# Altium footprint library Cty1.PcbLib: 869 footprints (part 29 of 55)
Each footprint in its own frame and in the unit in brackets; x right, y up, seen from the top. Pads: shape width x height; smd on the part's side, far side on the other; paste and mask are expansions set on the pad; w line width, h text height; cw(c..) or ccw(c..) is an arc to the next point about the centre after c.
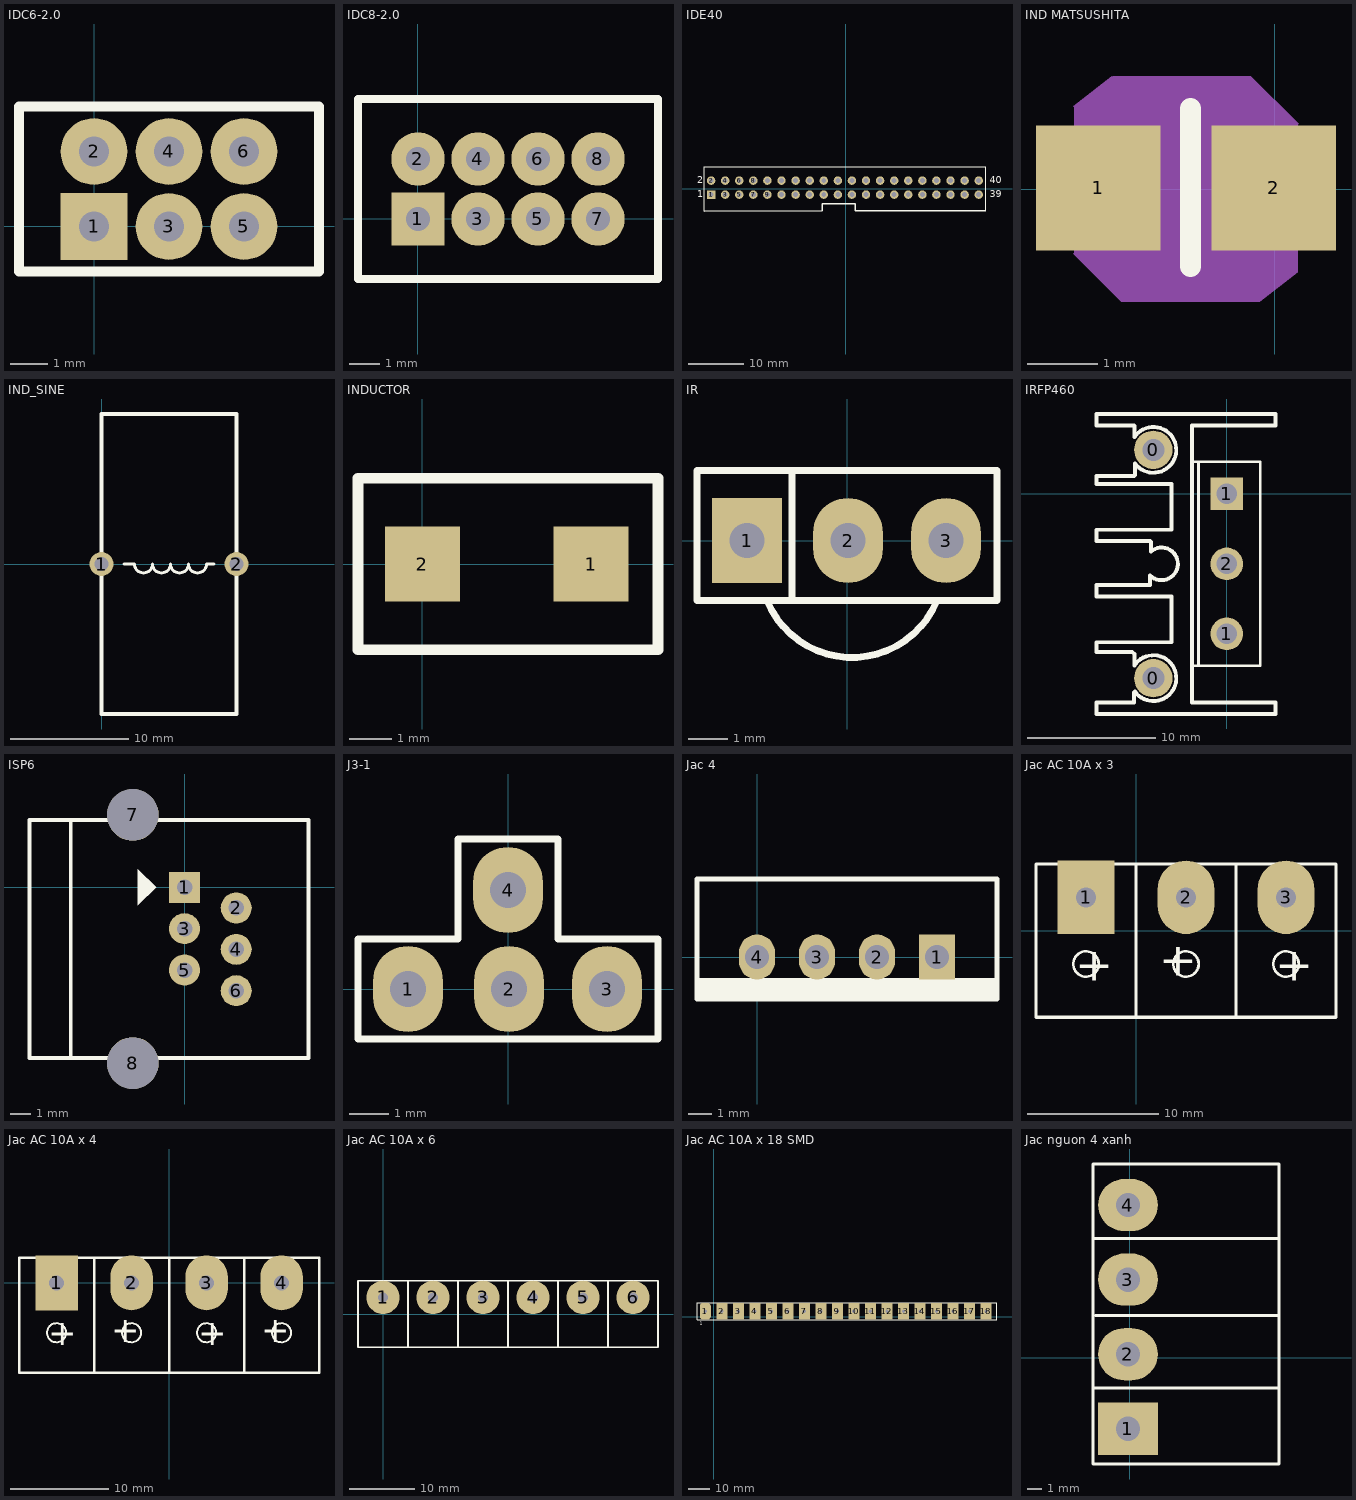
[diagram p28: the footprints below, top view; thin cyan lines are the x and y axes]

## IDC6-2.0 [mil]
pads (6):
  rect 70x70 hole 32 unplated: 1(0,0)
  round 70 hole 32 unplated: 2(0,78.74) 3(78.74,0) 4(78.74,78.74) 5(157.48,0) 6(157.48,78.74)
Top Overlay:
  lines w10: -78.74,-47.24 236.22,-47.24 236.22,125.98 -78.74,125.98 -78.74,-47.24

## IDC8-2.0 [mil]
pads (8):
  rect 70x70 hole 32 unplated: 1(0,0)
  round 70 hole 32 unplated: 2(0,78.74) 3(78.74,0) 4(78.74,78.74) 5(157.48,0) 6(157.48,78.74) 7(236.22,0) 8(236.22,78.74)
Top Overlay:
  lines w10: -78.74,-78.74 314.96,-78.74 314.96,157.48 -78.74,157.48 -78.74,0 -78.74,-78.74

## IDE40 [mil]
pads (40):
  rect 60x60 hole 35 unplated: 1(-955.2,-43.54)
  round 60 hole 35 unplated: 2(-955.2,56.46) 3(-855.2,-43.54) 4(-855.2,56.46) 5(-755.2,-43.54) 6(-755.2,56.46) 7(-655.2,-43.54) 8(-655.2,56.46) 9(-555.2,-43.54) 10(-555.2,56.46) 11(-455.2,-43.54) 12(-455.2,56.46) 13(-355.2,-43.54) 14(-355.2,56.46) 15(-255.2,-43.54) 16(-255.2,56.46) 17(-155.2,-43.54) 18(-155.2,56.46) 19(-55.2,-43.54) 20(-55.2,56.46) 21(44.8,-43.54) 22(44.8,56.46) 23(144.8,-43.54) 24(144.8,56.46) 25(244.8,-43.54) 26(244.8,56.46) 27(344.8,-43.54) 28(344.8,56.46) 29(444.8,-43.54) 30(444.8,56.46) 31(544.8,-43.54) 32(544.8,56.46) 33(644.8,-43.54) 34(644.8,56.46) 35(744.8,-43.54) 36(744.8,56.46) 37(844.8,-43.54) 38(844.8,56.46) 39(944.8,-43.54) 40(944.8,56.46)
Top Overlay:
  lines w7.87: -1005.2,-162.44 -1005.2,155.67 994.8,155.67 994.09,-157.48
  lines w10: -1005.2,-162.44 -167.32,-157.48 -167.32,-127.95 -167.32,-108.27 68.9,-108.27 68.9,-157.48 994.09,-157.48
  text "39" at 1024.8,-63.54 h50
  text "40" at 1024.8,36.46 h50
  text "2" at -1055.2,36.46 h50
  text "1" at -1055.2,-63.54 h50

## IND MATSUSHITA [mil]
pads (2):
  rect 70x70 smd: 1(-98.98,0.79) 2(-0.55,0.79)
Top Overlay:
  lines w11.81: -47.24,-43.31 -47.24,45.28
Mechanical 2:
  rectangle: -34.01,-46.45 13.23,36.23
  rectangle: -112.75,-36.61 -86.18,46.66
  rectangle: -86.18,-63.18 -8.42,2.55
  rectangle: -91.1,-2.13 -13.35,63.61
  region: -86.18,-63.15 13.72,36.75 -13.35,63.81 -113.25,-36.09
  region: -101.04,31.12 -79.29,48.04 -91.38,63.58 -113.13,46.66
  region: -8.52,-63.37 13.23,-46.45 1.14,-30.91 -20.61,-47.83
Mechanical 6:
  lines w1.97: -86.77,10.63 13.23,10.63 ; 5.36,8 13.23,10.63 ; 5.36,13.25 13.23,10.63 ; 13.23,8.66 13.23,12.6

## IND_SINE [mil]
pads (2):
  round 80 hole 47.24: 1(0,0) 2(450,0)
Top Overlay:
  lines w10: 75,0 110,0 ccw(c140,0) 170,0 ccw(c200,0) 230,0 ccw(c260,0) 290,0 ccw(c320,0) 350,0 375,0
  lines w12: 0,-500 0,0 0,500 450,500 450,-500 0,-500

## INDUCTOR [mil]
pads (2):
  rect 70x70 smd: 1(157.48,0) 2(0,0)
Top Overlay:
  lines w10: -60,-80 -60,80 220,80 220,-80 -60,-80

## IR [mil] "Receiver Infared IC"
height 200
pads (3):
  rect 70x85 hole 35: 1(-100,0)
  oval 70x85 hole 35: 2(1,0) 3(99,0)
Top Overlay:
  lines w7: -80,-60 ccw(c5,-25) 90,-60 ; -55,-60 -55,70 ; -150,-60 -150,70 150,70 150,-60 -150,-60

## IRFP460 [mm]
pads (5):
  round 3 hole 1.7: 0(-5.715,-14.351) 0(-5.715,3.429)
  round 2.54 hole 1.6: 1(0,-10.9) 2(0,-5.45)
  rect 2.54x2.54 hole 1.6: 1(0,0)
Top Overlay:
  lines w0.2: -2.2,-13.4 -2.2,2.5 ; -2.7,-13.4 2.6,-13.4 2.6,2.5 -2.7,2.5 -2.7,-13.4
  lines w0.305: -2.7,2.159 -2.7,5.334 3.81,5.334 3.81,6.223 -10.16,6.223 -10.16,5.334 -7.239,5.334 -7.198,5.293 -7.198,4.418 cw(c-5.715,3.429) -7.157,2.381 -7.157,1.479 -7.239,1.397 -8.382,1.397 -10.16,1.397 -10.16,0.762 -4.318,0.762 -4.318,-2.794 -10.16,-2.794 -10.16,-3.683 -5.969,-3.683 -5.9,-3.752 -5.9,-4.48 cw(c-5.08,-5.45) -5.972,-6.354 -5.972,-7.109 -5.969,-7.112 -10.16,-7.112 -10.16,-8.001 -4.318,-8.001 -4.318,-11.557 -10.16,-11.557 -10.16,-12.319 -7.366,-12.319 -7.198,-12.487 -7.198,-13.362 cw(c-5.715,-14.351) -7.157,-15.399 -7.239,-15.482 -7.239,-16.256 -10.16,-16.256 -10.16,-17.145 3.81,-17.145 3.81,-16.256 -2.7,-16.256 -2.7,3.048

## ISP6 [mil] "Jac nap PIC"
pads (8):
  rect 60x60 hole 30: 1(0,0)
  round 60 hole 30: 2(100,-40) 3(0,-80) 4(100,-120) 5(0,-160) 6(100,-200)
  round 100 hole 100: 7(-100,140) 8(-100,-340)
Top Overlay:
  region: -55,0 -90,35 -90,-35
  lines w7: -220,-330 -220,130
  lines w8: -300,-330 -300,130 240,130 240,-330 -300,-330

## J3-1 [mil] "Jumper 4"
height 200
pads (4):
  oval 70x86 hole 36: 1(-100,0) 2(1,0) 3(99,0) 4(0,99)
Top Overlay:
  lines w7: -150,-50 150,-50 150,50 50,50 50,150 -50,150 -50,50 -150,50 -150,-50

## Jac 4 [mil] "Jac connect 4pin"
pads (4):
  rect 60x75 hole 40: 1(300,0)
  oval 60x75 hole 40: 2(200,0) 3(100,0) 4(0,0)
Top Overlay:
  rectangle: -100,-70 400,-35
  lines w7.87: -100,-70 400,-70 400,130 -100,130 -100,-70

## Jac AC 10A x 3 [mil] "Jac nguon 220V 10A"
pads (3):
  rect 170x220 hole 60: 1(-150,100)
  oval 170x220 hole 60: 2(150,100) 3(450,100)
Top Overlay:
  circle w8: c-150,-100 r38.08
  circle w8: c150,-100 r38.08
  circle w8: c450,-100 r38.08
  lines w10: 0,-260 0,200 ; 300,-260 300,-200 ; 300,-260 -300,-260 -300,200 300,200 ; 300,-260 300,200 ; 300,-260 600,-260 600,200 300,200 ; 300,-200 300,200 ; 300,-200 300,200
  text "+" at -183,-150 h100
  text "+" at 183,-50 h100
  text "+" at 417,-150 h100

## Jac AC 10A x 4 [mil] "Jac nguon 220V 10A"
pads (4):
  rect 170x220 hole 60: 1(-450,0)
  oval 170x220 hole 60: 2(-150,0) 3(150,0) 4(450,0)
Top Overlay:
  circle w8: c450,-200 r38.08
  circle w8: c150,-200 r38.08
  circle w8: c-150,-200 r38.08
  circle w8: c-450,-200 r38.08
  lines w10: -300,-360 -300,100 ; 300,-360 300,100 ; 0,-360 600,-360 600,-300 ; 0,-360 0,100 ; 0,-360 -600,-360 -600,100 0,100 ; 0,-360 0,-300 ; 0,-300 0,100 ; 0,-300 0,100 ; 0,100 600,100 ; 600,-300 600,100 ; 600,-300 600,100
  text "+" at 483,-150 h100
  text "+" at 117,-250 h100
  text "+" at -117,-150 h100
  text "+" at -483,-250 h100

## Jac AC 10A x 6 [mil] "Jac nguon 220V 10A"
pads (6):
  round 200 hole 60: 1(0,100) 2(300,100) 3(600,100) 4(900,100) 5(1200,100) 6(1500,100)
Top Overlay:
  lines w10: 150,-200 150,200 ; 750,-200 750,200 ; 1350,-200 1350,200 ; 450,-200 1050,-200 ; 450,-200 450,200 ; 450,-200 450,200 ; 450,-200 -150,-200 -150,200 450,200 ; 450,200 1050,200 ; 1050,-200 1050,200 ; 1050,-200 1050,200 ; 1050,-200 1650,-200 1650,200 1050,200 ; 1050,-200 1050,200

## Jac AC 10A x 18 SMD [mil] "Jac nguon 220V 10A"
pads (18):
  rrect50% 200x300 hole 60: 1(-150,100)
  rect 200x300 hole 60: 2(150,100) 3(450,100) 4(750,100) 5(1050,100) 6(1350,100) 7(1650,100) 8(1950,100) 9(2250,100) 10(2550,100) 11(2850,100) 12(3150,100) 13(3450,100) 14(3750,100) 15(4050,100) 16(4350,100) 17(4650,100) 18(4950,100)
Top Overlay:
  lines w10: -300,-50 -300,250 5150,250 5150,-50 -300,-50
  text "1" at -250,-150 h60

## Jac nguon 4 xanh [mil] "Cau dau nguon xanh"
pads (4):
  rect 160x140 hole 65: 1(-5,-190)
  oval 160x140 hole 65: 2(-5,10) 3(-5,210) 4(-5,410)
Top Overlay:
  lines w8: -98.66,520 -98.66,-284.25 400,-284.25 400,519.75 -97.66,519.75 ; -97.66,-80.25 400,-80.25 ; -97.66,319.75 395,319.75 ; -91.66,113.75 400,113.75